# Altium footprint library Connectors.PcbLib: 104 footprints (part 7 of 7)
Each footprint in its own frame and in the unit in brackets; x right, y up, seen from the top. Pads: shape width x height; smd on the part's side, far side on the other; paste and mask are expansions set on the pad; w line width, h text height; cw(c..) or ccw(c..) is an arc to the next point about the centre after c.
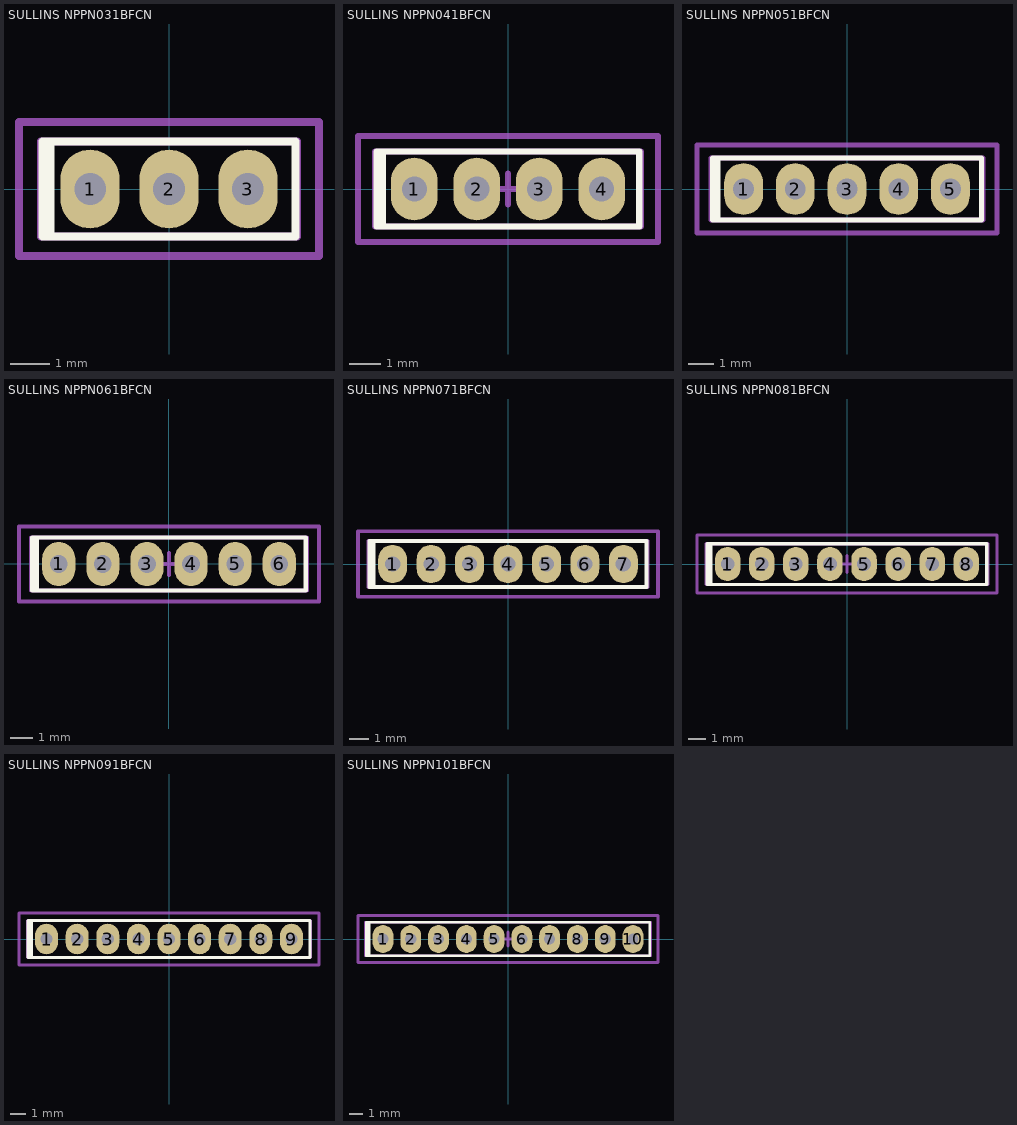
[diagram p6: the footprints below, top view; thin cyan lines are the x and y axes]

## SULLINS NPPN031BFCN [mm]
height 4.4
pads (3):
  oval 1.5x2 hole 0.8: 1(-2,0) 2(0,0) 3(2,0)
Top Overlay:
  lines w0.2: -3,-1.2 -3,1.2 ; -3.2,-1.2 3.2,-1.2 3.2,1.2 -3.2,1.2 -3.2,-1.2
Mechanical 1:
  lines w0.2: -3.25,-1.2 3.2,-1.2 3.25,-1.2 3.25,1.2 -3.25,1.2 -3.25,-1.2
Mechanical 15:
  lines w0.2: -0.5,0 0.5,0 ; 0,-0.5 0,0.5 ; -3.8,-1.7 3.8,-1.7 3.8,1.7 -3.8,1.7 -3.8,-1.7
3D body "Sullins NPPN031BFCN-RC.STEP": height 4.41, standoff -2.39, extent -3.25,-1.2 3.25,1.2

## SULLINS NPPN041BFCN [mm]
height 4.4
pads (4):
  oval 1.5x2 hole 0.8: 1(-3,0) 2(-1,0) 3(1,0) 4(3,0)
Top Overlay:
  lines w0.2: -4,-1.2 -4,1.2 ; -4.2,-1.2 4.2,-1.2 4.2,1.2 -4.2,1.2 -4.2,-1.2
Mechanical 1:
  lines w0.2: 4.25,-1.2 4.25,1.2 -4.25,1.2 -4.25,-1.2 4.25,-1.2
Mechanical 15:
  lines w0.2: -0.5,0 0.5,0 ; 0,-0.5 0,0.5 ; -4.8,-1.7 4.8,-1.7 4.8,1.7 -4.8,1.7 -4.8,-1.7
3D body "Sullins NPPN041BFCN-RC.STEP": height 4.41, standoff -2.39, extent -4.25,-1.2 4.25,1.2

## SULLINS NPPN051BFCN [mm]
height 4.4
pads (5):
  oval 1.5x2 hole 0.8: 1(-4,0) 2(-2,0) 3(0,0) 4(2,0) 5(4,0)
Top Overlay:
  lines w0.2: -5,-1.2 -5,1.2 ; -5.2,-1.2 -5.2,1.2 5.2,1.2 5.2,-1.2 -5.2,-1.2
Mechanical 1:
  lines w0.2: -5.25,-1.2 -5.25,1.2 5.25,1.2 5.25,-1.2 -5.25,-1.2
Mechanical 15:
  lines w0.2: -0.5,0 0.5,0 ; 0,-0.5 0,0.5 ; -5.8,-1.7 -5.8,1.7 5.8,1.7 5.8,-1.7 -5.8,-1.7
3D body "Sullins NPPN051BFCN-RC.STEP": height 4.41, standoff -2.39, extent -5.25,-1.2 5.25,1.2

## SULLINS NPPN061BFCN [mm]
height 4.4
pads (6):
  oval 1.5x2 hole 0.8: 1(-5,0) 2(-3,0) 3(-1,0) 4(1,0) 5(3,0) 6(5,0)
Top Overlay:
  lines w0.2: -6,-1.2 -6,1.2 ; -6.2,-1.2 -6.2,1.2 6.2,1.2 6.2,-1.2 -6.2,-1.2
Mechanical 1:
  lines w0.2: -6.25,-1.2 -6.25,1.2 6.25,1.2 6.25,-1.2 -6.25,-1.2
Mechanical 15:
  lines w0.2: -0.5,0 0.5,0 ; 0,-0.5 0,0.5 ; -6.8,-1.7 -6.8,1.7 6.8,1.7 6.8,-1.7 -6.8,-1.7
3D body "Sullins NPPN061BFCN-RC.STEP": height 4.41, standoff -2.39, extent -6.25,-1.2 6.25,1.2

## SULLINS NPPN071BFCN [mm]
height 4.4
pads (7):
  oval 1.5x2 hole 0.8: 1(-6,0) 2(-4,0) 3(-2,0) 4(0,0) 5(2,0) 6(4,0) 7(6,0)
Top Overlay:
  lines w0.2: -7,-1.2 -7,1.2 ; -7.2,-1.2 -7.2,1.2 7.2,1.2 7.2,-1.2 -7.2,-1.2
Mechanical 1:
  lines w0.2: -7.25,-1.2 -7.25,1.2 7.25,1.2 7.25,-1.2 -7.25,-1.2
Mechanical 15:
  lines w0.2: -0.5,0 0.5,0 ; 0,-0.5 0,0.5 ; -7.8,-1.7 -7.8,1.7 7.8,1.7 7.8,-1.7 -7.8,-1.7
3D body "Sullins NPPN071BFCN-RC.STEP": height 4.41, standoff -2.39, extent -7.25,-1.2 7.25,1.2

## SULLINS NPPN081BFCN [mm]
height 4.4
pads (8):
  oval 1.5x2 hole 0.8: 1(-7,0) 2(-5,0) 3(-3,0) 4(-1,0) 5(1,0) 6(3,0) 7(5,0) 8(7,0)
Top Overlay:
  lines w0.2: -8,-1.2 -8,1.2 ; -8.2,-1.2 8.2,-1.2 8.2,1.2 -8.2,1.2 -8.2,-1.2
Mechanical 1:
  lines w0.2: -8.25,-1.2 8.25,-1.2 8.25,1.2 -8.25,1.2 -8.25,-1.2
Mechanical 15:
  lines w0.2: -0.5,0 0.5,0 ; 0,-0.5 0,0.5 ; -8.8,-1.7 8.8,-1.7 8.8,1.7 -8.8,1.7 -8.8,-1.7
3D body "Sullins NPPN081BFCN-RC.STEP": height 4.41, standoff -2.39, extent -8.25,-1.2 8.25,1.2

## SULLINS NPPN091BFCN [mm]
height 4.4
pads (9):
  oval 1.5x2 hole 0.8: 1(-8,0) 2(-6,0) 3(-4,0) 4(-2,0) 5(0,0) 6(2,0) 7(4,0) 8(6,0) 9(8,0)
Top Overlay:
  lines w0.2: -9,-1.2 -9,1.2 ; -9.2,-1.2 -9.2,1.2 9.2,1.2 9.2,-1.2 -9.2,-1.2
Mechanical 1:
  lines w0.2: 9.25,-1.2 9.25,1.2 ; 9.25,-1.2 -9.25,-1.2 -9.25,1.2 9.25,1.2
Mechanical 15:
  lines w0.2: -0.5,0 0.5,0 ; 0,-0.5 0,0.5 ; -9.8,-1.7 -9.8,1.7 9.8,1.7 9.8,-1.7 -9.8,-1.7
3D body "Sullins NPPN091BFCN-RC.STEP": height 4.41, standoff -2.39, extent -9.25,-1.2 9.25,1.2

## SULLINS NPPN101BFCN [mm]
height 4.4
pads (10):
  oval 1.5x2 hole 0.8: 1(-9,0) 2(-7,0) 3(-5,0) 4(-3,0) 5(-1,0) 6(1,0) 7(3,0) 8(5,0) 9(7,0) 10(9,0)
Top Overlay:
  lines w0.2: -10,-1.2 -10,1.2 ; -10.2,-1.2 -10.2,1.2 10.2,1.2 10.2,-1.2 -10.2,-1.2
Mechanical 1:
  lines w0.2: -10.25,-1.2 -10.25,1.2 10.25,1.2 10.25,-1.2 -10.25,-1.2
Mechanical 15:
  lines w0.2: -0.5,0 0.5,0 ; 0,-0.5 0,0.5 ; -10.8,-1.7 10.8,-1.7 10.8,1.7 -10.8,1.7 -10.8,-1.7
3D body "Sullins NPPN101BFCN-RC.STEP": height 4.41, standoff -2.39, extent -10.25,-1.2 10.25,1.2